# Altium footprint library THU.PcbLib: 477 footprints (part 26 of 30)
Each footprint in its own frame and in the unit in brackets; x right, y up, seen from the top. Pads: shape width x height; smd on the part's side, far side on the other; paste and mask are expansions set on the pad; w line width, h text height; cw(c..) or ccw(c..) is an arc to the next point about the centre after c.
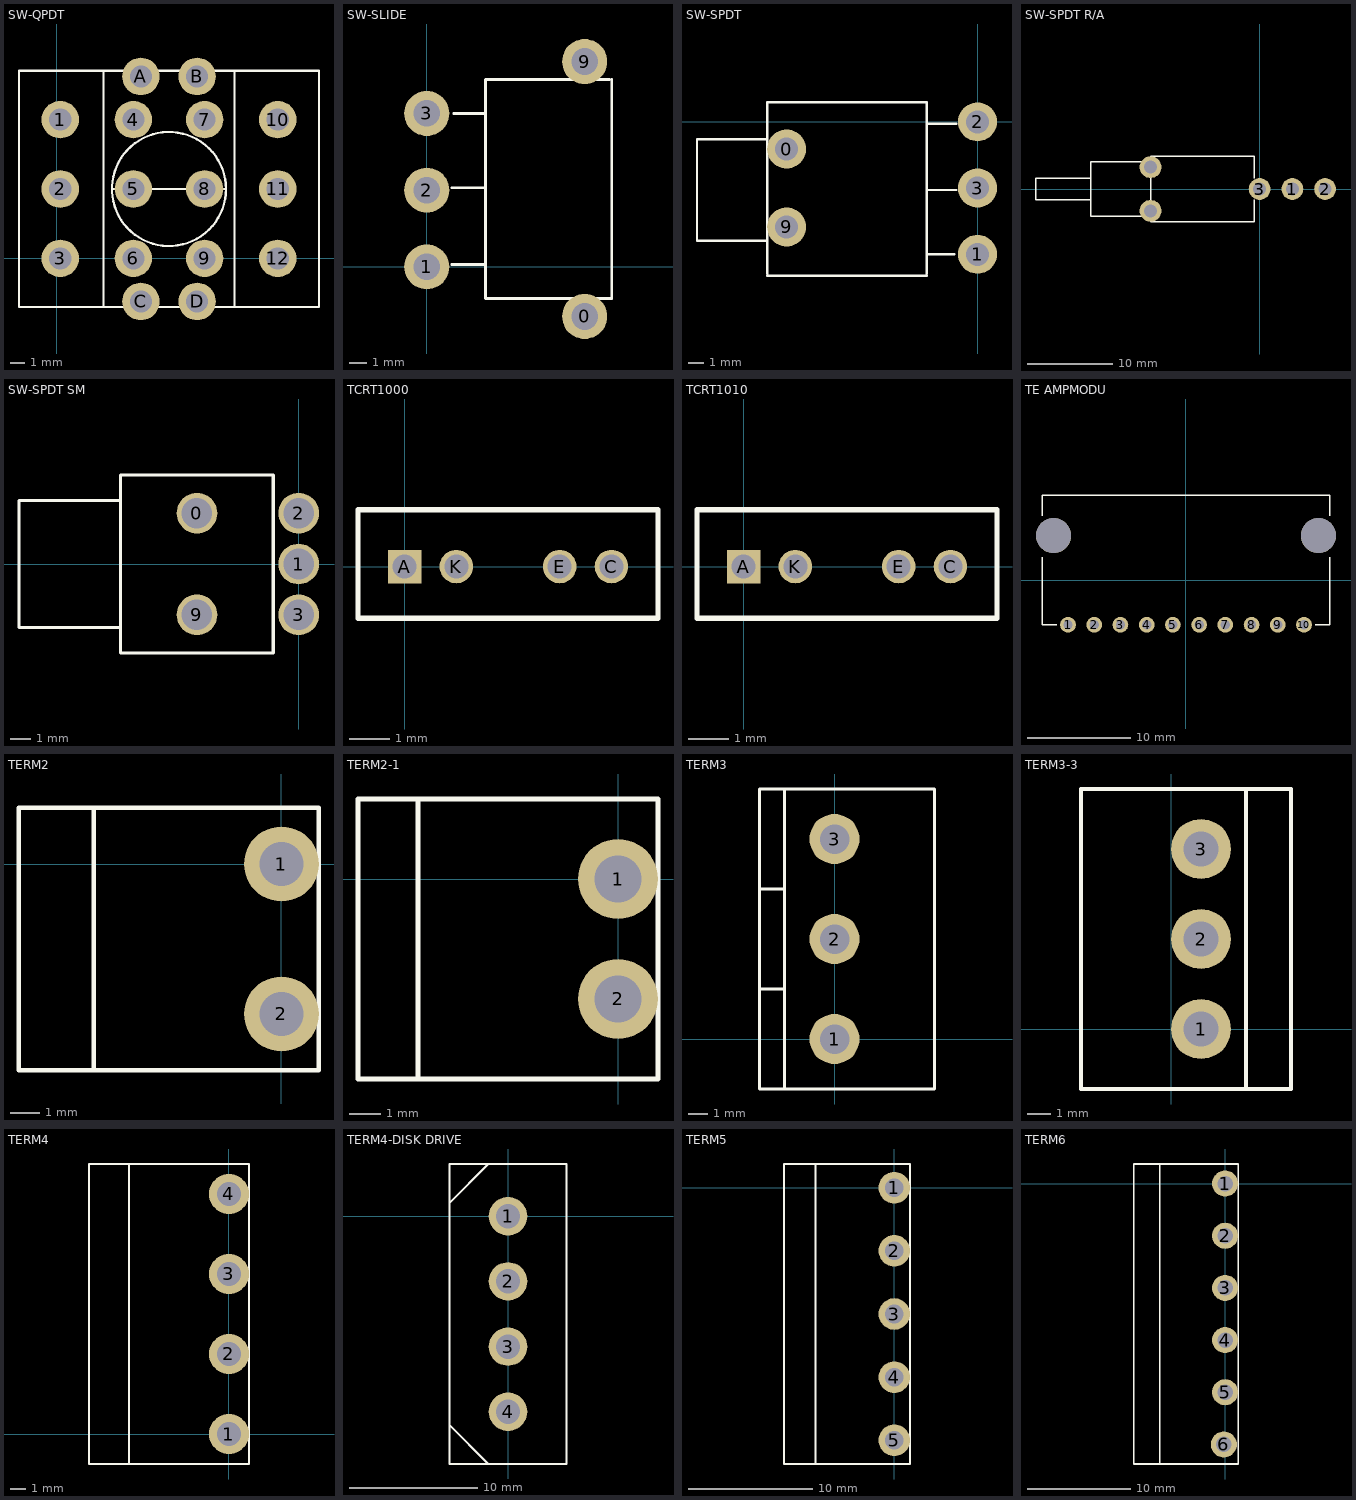
[diagram p25: the footprints below, top view; thin cyan lines are the x and y axes]

## SW-QPDT [mil]
pads (16):
  round 100 hole 59: 1(10,370) 2(10,185) 3(10,0) 4(205,370) 5(205,185) 6(205,0) 7(395,370) 8(395,185) 9(395,0) 10(590,370) 11(590,185) 12(590,0) A(225,485) B(375,485) C(225,-115) D(375,-115)
TopOverlay:
  circle w6: c300,185 r152.07
  lines w6: 125,-130 125,500 ; 150,185 450,185 ; 475,-130 475,500 ; -100,-130 -100,500 700,500 700,-130 -100,-130

## SW-SLIDE [mil]
pads (5):
  round 100 hole 59: 0(350,-110) 1(0,0) 2(0,170) 3(0,340) 9(350,455)
TopOverlay:
  lines w6: 55,5 130,5 ; 55,175 130,175 ; 60,340 130,340 ; 405,415 130,415 130,175 ; 410,415 410,-70 130,-70 130,175

## SW-SPDT [mil]
pads (5):
  round 100 hole 59: 0(-490,-70) 1(0,-340) 2(0,0) 3(0,-170) 9(-490,-270)
TopOverlay:
  lines w6: -545,-45 -720,-45 -720,-305 -540,-305 ; -540,-395 -130,-395 ; -540,-390 -540,50 -130,50 -130,-175 ; -130,-390 -130,-175 ; -130,-340 -60,-340 ; -130,-5 -55,-5 ; -55,-175 -130,-175

## SW-SPDT R/A [mil]
pads (5):
  round 100 hole 59: 1(150,0) 2(300,0) 3(0,0) ""(-500,-100) ""(-500,100)
TopOverlay:
  lines w6: -775,-50 -1025,-50 -1025,50 -775,50 ; -500,-125 -775,-125 -775,125 -500,125 ; -25,-50 -25,-150 -500,-150 -500,150 -25,150 -25,50

## SW-SPDT SM [mil]
pads (5):
  round 80 hole 60: 0(-200,100) 1(0,0) 2(0,100) 3(0,-100) 9(-200,-100)
TopOverlay:
  lines w6: -350,-125 -550,-125 -550,125 -350,125 ; -350,-175 -350,175 -50,175 -50,-175 -350,-175

## TCRT1000 [mil]
pads (4):
  rect 32.44x32.44 hole 23.19: A(0,0)
  round 32.44 hole 23.19: C(200,0) E(150,0) K(50,0)
TopOverlay:
  lines w5: -45,-50 -45,55 245,55 245,-50 -45,-50
3D body: height 39.37, standoff 0, extent -39.37,-3.94 15.75,7.87
3D body: height 82.68, standoff -78.74, extent 192.91,-3.94 208.66,7.87
3D body: height 82.68, standoff -78.74, extent 141.73,-3.94 157.48,7.87
3D body: height 82.68, standoff -78.74, extent 43.31,-3.94 59.06,7.87
3D body: height 82.68, standoff -78.74, extent -7.87,-3.94 7.87,7.87
3D body: height 208.66, standoff 129.92, extent 108.31,-88.48 187.01,-9.94
3D body: height 208.66, standoff 129.92, extent 9.88,-88.48 88.59,-9.94
3D body: height 240.16, standoff 82.68, extent -45,-50 245,55
3D body: height 39.37, standoff 0, extent 31.5,-3.94 86.61,7.87
3D body: height 39.37, standoff 0, extent 181.1,-3.41 236.22,8.4
3D body: height 39.37, standoff 0, extent 114.17,-3.41 169.29,8.41

## TCRT1010 [mil]
pads (4):
  rect 32.44x32.44 hole 23.19: A(0,0)
  round 32.44 hole 23.19: C(200,0) E(150,0) K(50,0)
TopOverlay:
  lines w5: -45,-50 245,-50 245,55 -45,55 -45,-50
3D body: height 125.98, standoff 47.24, extent 110.67,137.9 189.38,216.44
3D body: height 125.98, standoff 47.24, extent 10.67,137.9 89.38,216.44
3D body: height 47.24, standoff 35.43, extent 114.17,23.62 169.29,55.12
3D body: height 47.24, standoff 35.43, extent 181.1,23.62 236.22,55.12
3D body: height 47.24, standoff 35.43, extent 31.5,23.62 86.61,55.12
3D body: height 47.24, standoff 35.43, extent -35.43,23.62 19.68,55.12
3D body: height 47.24, standoff 35.43, extent 192.91,-3.94 208.66,82.68
3D body: height 47.24, standoff 35.43, extent 141.73,-3.94 157.48,82.68
3D body: height 47.24, standoff 35.43, extent 43.31,-3.94 59.06,82.68
3D body: height 47.24, standoff 35.43, extent -7.87,-3.94 7.87,82.68
3D body: height 98.43, standoff 7.87, extent -43.31,82.68 244.09,240.16
3D body: height 35.43, standoff -78.74, extent -7.87,-3.94 7.87,7.87
3D body: height 35.43, standoff -78.74, extent 43.31,-3.94 59.06,7.87
3D body: height 35.43, standoff -78.74, extent 141.73,-3.94 157.48,7.87
3D body: height 35.43, standoff -78.74, extent 192.91,-3.94 208.66,7.87

## TE AMPMODU [mm] "5-103672-9"
height 5.08
pads (12):
  round 1.524 hole 0.9: 1(-11.43,-4.32) 2(-8.89,-4.32) 3(-6.35,-4.32) 4(-3.81,-4.32) 5(-1.27,-4.32) 6(1.27,-4.32) 7(3.81,-4.32) 8(6.35,-4.32) 9(8.89,-4.32) 10(11.43,-4.32)
  round 3.4 hole 3.4 unplated: ""(-12.83,4.32) ""(12.83,4.32)
TopOverlay:
  lines w0.127: -13.905,2.25 -13.905,-4.32 -12.5,-4.32 ; -13.905,6.25 -13.905,8.23 0,8.23 13.905,8.23 13.905,6.25 ; 12.5,-4.32 13.905,-4.32 13.905,2.25
3D body "c-5-103672-9-ak-3d.stp": height 6.99, standoff -3.8, extent -13.905,-5.5 13.905,8.09

## TERM2 [mil]
pads (2):
  round 100 hole 59: 1(0,0) 2(0,-200)
TopOverlay:
  lines w6: -250,-275 -250,75 ; -350,-275 -350,75 50,75 50,-275 -350,-275

## TERM2-1 [mil]
pads (2):
  round 100 hole 59: 1(0,0) 2(0,-150)
TopOverlay:
  lines w6: -325,-250 -325,100 ; -325,-250 50,-250 50,100 -325,100 ; -325,-250 -250,-250 -250,100 -325,100

## TERM3 [mil]
pads (3):
  round 100 hole 59: 1(0,0) 2(0,200) 3(0,400)
TopOverlay:
  lines w6: -150,100 -100,100 ; -150,300 -100,300 ; -100,-100 -100,500 ; -150,-100 200,-100 200,500 -150,500 -150,-100

## TERM3-3 [mil]
pads (3):
  round 100 hole 59: 1(50,0) 2(50,150) 3(50,300)
TopOverlay:
  lines w6: 125,-100 125,400 ; -150,-100 -150,400 200,400 200,-100 -150,-100

## TERM4 [mil]
pads (4):
  round 100 hole 59: 1(0,0) 2(0,200) 3(0,400) 4(0,600)
TopOverlay:
  lines w6: -250,-75 -250,300 -250,675 ; -350,-75 50,-75 50,300 50,675 -350,675 -350,300 -350,-75
3D body: height 177.17, standoff 137.8, extent -295.28,-19.68 -49.21,19.68
3D body: height 177.17, standoff 137.8, extent -295.28,180.31 -49.21,219.69
3D body: height 177.17, standoff 137.8, extent -295.28,380.31 -49.21,419.69
3D body: height 177.17, standoff 137.8, extent -295.28,580.32 -49.21,619.68
3D body: height 326.77, standoff 0, extent -49.21,-79.13 49.21,678.74
3D body: height 326.77, standoff 263.78, extent -354.33,-79.13 49.21,678.74
3D body: height 62.99, standoff 0, extent -354.33,-79.13 49.21,678.74

## TERM4-DISK DRIVE [mm]
pads (4):
  round 3 hole 1.9: 1(0,0) 2(0,-5.08) 3(0,-10.16) 4(0,-15.24)
TopOverlay:
  lines w0.152: -4.572,-16.256 -4.572,-19.304 -1.524,-19.304 ; -4.572,-16.256 -4.572,1.016 ; -4.572,-16.256 -1.524,-19.304 ; -4.572,1.016 -4.572,4.064 -1.524,4.064 ; -4.572,1.016 -1.524,4.064 ; -1.524,-19.304 4.572,-19.304 4.572,-7.62 4.572,4.064 -1.524,4.064

## TERM5 [mil]
pads (5):
  round 100 hole 59: 1(0,0) 2(0,-200) 3(0,-400) 4(0,-600) 5(0,-800)
TopOverlay:
  lines w6: -250,-875 -250,-300 -250,75 ; -350,-875 -350,-300 -350,75 50,75 50,-300 50,-875 -350,-875

## TERM6 [mil]
pads (6):
  round 100 hole 59: 1(0,0) 2(0,-200) 3(0,-400) 4(0,-600) 5(0,-800) 6(-5,-1000)
TopOverlay:
  lines w6: -250,-1075 -250,75 ; -350,-1075 50,-1075 50,-300 50,75 -350,75 -350,-300 -350,-1075